# Altium integrated library Self made library.IntLib: 370 symbols (part 1 of 3) (continued)
## C_1206_100NF/50V (continued)
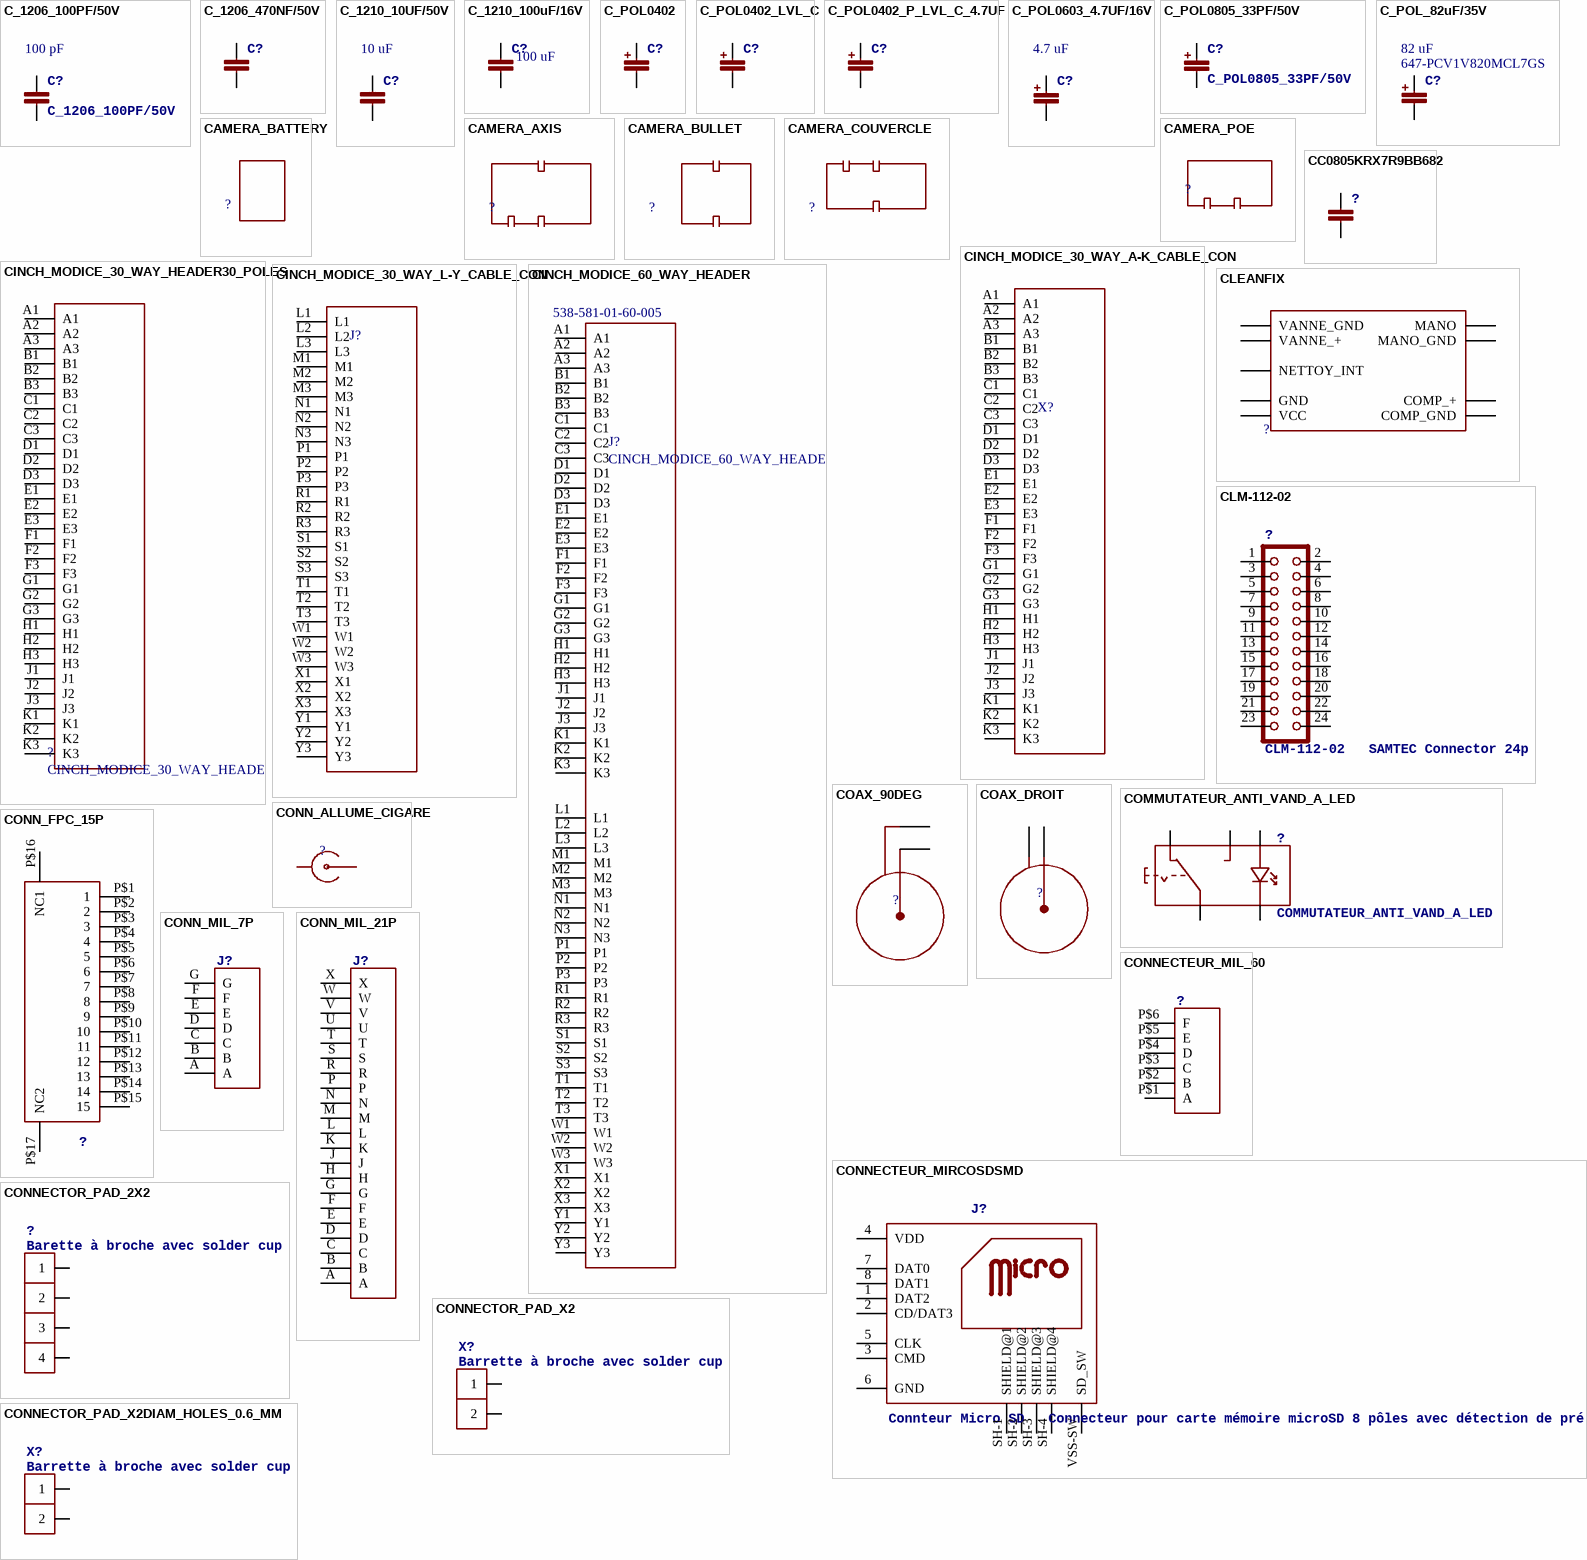
[diagram p6: symbols C_1206_100PF/50V to CONNECTOR_PAD_X2DIAM_HOLES_0.6_MM]

## C_1206_100PF/50V
designator C?  Capacitance: 100 pF
Manufacturer: Kemet; Manufacturer Part Number: C1206C101K5RACTU; Tolerance: 10 %; Type: SMD MLCC X7R 6.3 - 250 VDC Commerical Grade; Voltage Rating DC: 50 VDC; Case Length: 3.2 mm; Case Width: 1.6 mm; Class: Class 2; Dielectric: X7R; Digger DTR: CMP4208; Supplier 1: Mouser; RoHS: RoHS Compliant; Category: Multilayer Ceramic Capacitors MLCC - SMD/SMT; Stock 1: 0; Package/Case: 1206 (3216 metric); Packaging: Reel; Product: General Type MLCCs; Series: C1206C; Termination Style: SMD/SMT; Voltage Rating AC: -; Brand: Kemet; Case Code - in: 1206; Case Code - mm: 3216; Case Height: -; Maximum Operating Temperature: + 125 C; Minimum Operating Temperature: - 55 C; Minimum Order Quantity: 1; Reeling: True; ComponentLink1URL: http://www.kemet.com/Lists/ProductCatalog/Attachments/53/KEM_C1002_X7R_SMD.pdf; ComponentLink1Description: http://www.kemet.com/Lists/ProductCatalog/Attachments/53/KEM_C1002_X7R_SMD.pdf; Supplier Part Number 1: N/A
footprint 1206
pins: 1, 2

## C_1206_470NF/50V
designator C?
footprint 1206_capacitor
pins: 1, 2

## C_1210_10UF/50V
designator C?  Capacitance: 10 uF  (hidden comment: C_1210_10UF/50V)
Manufacturer: Murata Electronics; Manufacturer Part Number: GRM32DF51H106ZA01K; Tolerance: - 20 %, + 80 %; Type: General Purpose MLCC; Voltage Rating DC: 50 V; Case Height: 2 mm; Case Length: 3.2 mm; Case Width: 2.5 mm; Dielectric: Y5V; Digger CMP: CMP4434; Supplier 1: Mouser; RoHS: RoHS Compliant; Category: Multilayer Ceramic Capacitors MLCC - SMD/SMT; Stock 1: 8364; Pricing 1: 1=1.43, 10=0.974, 100=0.576, 1000=0.525, 4000=0.339, 8000=0.334, 24000=0.327 (CHF); Package/Case: 1210 (3225 metric); Packaging: Reel; Product: General Type MLCCs; Series: GRM; Termination Style: SMD/SMT; Brand: Murata Electronics; Case Code - in: 1210; Case Code - mm: 3225; Maximum Operating Temperature: + 85 C; Minimum Operating Temperature: - 30 C; Standard Pack Qty: 4000; RoHS - Mouser: Y; Minimum Order Quantity: 1; Reeling: True; ComponentLink1URL: http://www.murata.com/products/catalog/pdf/c02e.pdf; ComponentLink1Description: http://www.murata.com/products/catalog/pdf/c02e.pdf; Supplier Part Number 1: 81-GRM32DF51H106ZA1K
footprint 1210_tick
pins: P$1 1, P$2 2

## C_1210_100uF/16V
designator C?  Capacité électrique: 100 uF  (hidden comment: C_1210_100uF/16V)
Manufacturer 1: Kemet; Manufacturer Part Number 1: C1210C107M4PACTU; Description 1: Condensateurs céramique multicouches MLCC - CMS 100uF 16volts 20% X5R; Plage de températures de fonctionnement: - 55 C to + 85 C; Package/Boîte: 1210 (3225 metric); Conditionnement: Reel; Produit: General Type MLCCs; Série: C1210C; Style du raccordement: SMD/SMT; Tolérance: 20 %; Type: SMD MLCC X5R 4 - 50 VDC Commerical Grade; Tension de voltage CC: 16 V; Code de caisse - po: 1210; Code de caisse - mm: 3225; Longueur du boîtier: 3.2 mm; Largeur du boîtier: 2.5 mm; Classe: Class 2; Diélectrique: X5R; Température de fonctionnement max.: + 85 C; Température de fonctionnement min.: - 55 C; Quantité standard du lot: 1000; Coefficient/Code de température: +/- 15 %; Product Status: New Product; Supplier 1: Mouser; Supplier Part Number 1: 80-C1210C107M4PACTU; RoHS: RoHS Compliant; Category: Condensateurs céramique multicouches MLCC - CMS; Stock 1: 7452; Pricing 1: 1=2.51, 10=1.92, 100=1.73, 250=1.43, 500=1.30, 1000=0.838, 2000=0.809, 5000=0.778, 10000=0.734 (CHF); Tension de fonctionnement CA: -; Marque: Kemet; Hauteur du boîtier: -; Facteur de dissipation DF: -; Fabricant: Kemet; RoHS - Mouser: Y; Minimum Order Quantity: 1; Reeling: True; ComponentLink1URL: http://www.mouser.com/ds/2/212/KEM_C1006_X5R_SMD-348855.pdf; ComponentLink1Description: http://www.mouser.com/ds/2/212/KEM_C1006_X5R_SMD-348855.pdf
footprint 1210 _Kemet
pins: 1, 2

## C_POL0402
designator C?
footprint 0402_POL
pins: 1 +, 2 -

## C_POL0402_LVL_C
designator C?
footprint C0402_LVL_C
pins: 1 +, 2 -

## C_POL0402_P_LVL_C_4.7UF
designator C?
MANUFACTURER: AVX; MANUFACTURER_PART_NUMBER: F981A475MUALZT; UNIT_PRICE: 1.80; SUPPLIER: Mouser; SUPPLIER_PART_NUMBER: 581-F981A475MUALZT
footprint C0402_POL_LVL_C
pins: 1 +, 2 -

## C_POL0603_4.7UF/16V
designator C?, comment 4.7 uF
MANUFACTURER: AVX; MANUFACTURER_PART_NUMBER: F981C475MMA; UNIT_PRICE: 0.90; Description 1: Condensateurs au tantale - CMS Solides 16volts 4.7uF 0.85x1.6; Plage de températures de fonctionnement: - 55 C to + 125 C; Package/Boîte: 0603 (1608 metric); Conditionnement: Reel; Produit: Tantalum Solid Standard Grade - Other Various; Série: F98; Style du raccordement: SMD/SMT; Tolérance: 20 %; Tension de voltage: 16 V; ESR: 12 Ohms; Courant de fuite: 800 nA; Code de caisse - po: 0603; Code de caisse - mm: 1608; Longueur du boîtier: 1.6 mm; Largeur du boîtier: 0.85 mm; Facteur de dissipation DF: 12; Code caisse du fabricant: M Case; Catégorie du produit: SMD Tantalum Capacitors; Quantité standard du lot: 4000; Nom commercial: FRAMELESS; SUPPLIER: Mouser; SUPPLIER_PART_NUMBER: 647-F981C475MMA; Supplier 1: Mouser; Supplier Part Number 1: 647-F981C475MMA; Manufacturer 1: AVX; RoHS: RoHS Compliant; Category: Condensateurs au tantale - CMS Solides; Stock 1: 2925; Pricing 1: 1=0.784, 10=0.753, 100=0.303, 500=0.276, 1000=0.254, 2000=0.219, 4000=0.169, 8000=0.158 (CHF); Marque: AVX; Fabricant: AVX; RoHS - Mouser: Y; Minimum Order Quantity: 1; Reeling: True; ComponentLink1URL: http://www.mouser.com/ds/2/40/f98-220204.pdf; ComponentLink1Description: http://www.mouser.com/ds/2/40/f98-220204.pdf; Manufacturer Part Number 1: F981C475MMA; Capacité électrique: 4.7 uF
footprint 0603_POL
pins: 1 +, 2 -

## C_POL0805_33PF/50V
designator C?
footprint 0805
pins: 1 +, 2 -

## C_POL_82uF/35V
designator C?  Capacitance: 82 uF  Supplier Part Number 1: 647-PCV1V820MCL7GS  (hidden comment: C_POL_82uF/35V)
Manufacturer: Nichicon; Manufacturer Part Number: PCV1V820MCL7GS; Description: Aluminium Organic Polymer Capacitors 35V 82uF 105C; Tolerance: 20 %; Voltage Rating DC: 35 V; ESR: 24 mOhms; Leakage Current: 574 uA; Case Diameter: 8 mm; Case Length: 10 mm; Dissipation Factor DF: 0.12; Load Life: 3000 Hour; Ripple Current: 3600 mA; Supplier 1: Mouser; RoHS: RoHS Compliant; Category: Aluminium Organic Polymer Capacitors; Stock 1: 1270; Pricing 1: 1=3.36, 10=2.59, 100=1.93, 500=1.31, 1000=1.16, 2500=1.07, 10000=1.03 (CHF); Packaging: Reel; Product: Organic Polymer Aluminum - SMD Capacitors; Series: PCV; Termination Style: SMD/SMT; Brand: Nichicon; Maximum Operating Temperature: + 105 C; Minimum Operating Temperature: - 55 C; Product Type: Can; Standard Pack Qty: 500; RoHS - Mouser: Y; Minimum Order Quantity: 1; Reeling: True; ComponentLink1URL: http://www.mouser.com/ds/2/293/e-cv-8125.pdf; ComponentLink1Description: http://www.mouser.com/ds/2/293/e-cv-8125.pdf
footprint PCV_8x10
pins: 1 +, 2 -

## CAMERA_AXIS
designator ?
footprint 0805

## CAMERA_BATTERY
designator ?

## CAMERA_BULLET
designator ?
footprint 0805

## CAMERA_COUVERCLE
designator ?
footprint 0805

## CAMERA_POE
designator ?
footprint 0805

## CC0805KRX7R9BB682
designator ?
footprint 0805
pins: 1, 2

## CINCH_MODICE_30_WAY_A-K_CABLE_CON
designator X?
footprint CINCH_MODICE_60_WAY_HEADER
pins: A1, A2, A3, B1, B2, B3, C1, C2, C3, D1, D2, D3, E1, E2, E3, F1, F2, F3, G1, G2, G3, H1, H2, H3, J1, J2, J3, K1, K2, K3

## CINCH_MODICE_30_WAY_HEADER30_POLES
designator ?, comment CINCH_MODICE_30_WAY_HEADER
footprint CINCH_MODICE_30_WAY_HEADER
pins: A1, A2, A3, B1, B2, B3, C1, C2, C3, D1, D2, D3, E1, E2, E3, F1, F2, F3, G1, G2, G3, H1, H2, H3, J1, J2, J3, K1, K2, K3

## CINCH_MODICE_30_WAY_L-Y_CABLE_CON
designator J?
footprint CINCH_MODICE_60_WAY_HEADER
pins: L1, L2, L3, M1, M2, M3, N1, N2, N3, P1, P2, P3, R1, R2, R3, S1, S2, S3, T1, T2, T3, W1, W2, W3, X1, X2, X3, Y1, Y2, Y3

## CINCH_MODICE_60_WAY_HEADER
designator J?  Supplier Part Number 1: 538-581-01-60-005
Manufacturer: Cinch; Manufacturer Part Number: 581-01-60-005; Current Rating: 3 A; Gender: Male; Mounting Angle: Vertical; Number of Positions: 60 Position; Pitch: 2.54 mm; Insulation Resistance: 1 GOhms; Digger CMP: CMP4441; Supplier 1: Mouser; RoHS: In Transition; Category: Automotive Connectors; Stock 1: 22; Pricing 1: 1=24.30, 5=22.76, 10=21.71, 25=21.19, 50=19.03, 100=18.35, 250=17.64, 500=17.22 (CHF); Color: Black; Contact Plating: Gold; Features: ModICE SHS, header, without ferrites; Number of Rows: 3 Row; Operating Temperature Range: - 55 C to + 135 C; Product: Headers; Series: ModICE; Termination Style: Crimp; Type: Without Ferrite; Brand: Cinch; Contact Material: Copper Alloy; Flammability Rating: UL 94 V-0; Mounting Style: Wire; Product Category: ModICE LE Headers - Modular I/O Connectors; RoHS - Mouser: T; Minimum Order Quantity: 1; Reeling: False; ComponentLink1URL: http://www.mouser.com/ds/2/643/1219441010-5810160031S_ICE60_rev_C-475596.pdf; ComponentLink1Description: http://www.mouser.com/ds/2/643/1219441010-5810160031S_ICE60_rev_C-475596.pdf
footprint CINCH_MODICE_60_WAY_HEADER
pins: A1, A2, A3, B1, B2, B3, C1, C2, C3, D1, D2, D3, E1, E2, E3, F1, F2, F3, G1, G2, G3, H1, H2, H3, J1, J2, J3, K1, K2, K3, L1, L2, L3, M1, M2, M3, N1, N2, N3, P1, P2, P3, R1, R2, R3, S1, S2, S3, T1, T2, T3, W1, W2, W3, X1, X2, X3, Y1, Y2, Y3

## CLEANFIX
designator ?
footprint 61302021121
pins: 1 COMP_+, 2 COMP_GND, 3 GND, 4 MANO, 5 MANO_GND, 6 NETTOY_INT, 7 VANNE_+, 8 VANNE_GND, 9 VCC

## CLM-112-02
designator ?, comment CLM-112-02   SAMTEC Connector 24p
footprint SAMTEC_CLM
pins: 1, 2, 3, 4, 5, 6, 7, 8, 9, 10, 11, 12, 13, 14, 15, 16, 17, 18, 19, 20, 21, 22, 23, 24

## COAX_90DEG
designator ?
footprint PAD_X2_1.1
pins: 1 P$1, 2 P$2

## COAX_DROIT
designator ?
footprint PAD_X2_1.1
pins: 1 P$1, 2 P$2

## COMMUTATEUR_ANTI_VAND_A_LED
designator ?
pins: P$1 A, P$2 A1, P$3 A2, P$4 A3, P$5 P$6 C

## CONN_ALLUME_CIGARE
designator ?
footprint 0805

## CONN_FPC_15P
designator ?
footprint FPC_ZIF_05MMX15
pins: P$1 1, P$2 2, P$3 3, P$4 4, P$5 5, P$6 6, P$7 7, P$8 8, P$9 9, P$10 10, P$11 11, P$12 12, P$13 13, P$14 14, P$15 15, P$16 NC1, P$17 NC2

## CONN_MIL_7P
designator J?
footprint CON_MIL_BIDON_7P
pins: A, B, C, D, E, F, G

## CONN_MIL_21P
designator J?
footprint CON_MIL_BIDON_21P
pins: A, B, C, D, E, F, G, H, J, K, L, M, N, P, R, S, T, U, V, W, X

## CONNECTEUR_MIL_60
designator ?
footprint COM6P_1.5MM2
pins: P$1 A, P$2 B, P$3 C, P$4 D, P$5 E, P$6 F

## CONNECTEUR_MIRCOSDSMD
designator J?, comment Connteur Micro SD   Connecteur pour carte mémoire microSD 8 pôles avec détection de présence, version Push-Push
footprint MICROSD_CARD_CONNECTOR
pins: 1 DAT2, 2 CD/DAT3, 3 CMD, 4 VDD, 5 CLK, 6 GND, 7 DAT0, 8 DAT1, SH-1 SHIELD@1, SH-2 SHIELD@2, SH-3 SHIELD@3, SH-4 SHIELD@4, VSS-SW SD_SW

## CONNECTOR_PAD_2X2
designator ?, comment Barette à broche avec solder cup
footprint HEADER_2x2_BONDING_WIRE
pins: 1, 2, 3, 4

## CONNECTOR_PAD_X2
designator X?, comment Barrette à broche avec solder cup
MANUFACTURER: preci-dip; MANUFACTURER_PART_NUMBER: 380-PP-1NN-00-001101; UNIT_PRICE: 0.4; SUPPLIER: preci-dip; SUPPLIER_PART_NUMBER: 380-PP-1NN-00-001101
footprint HEADER_2
pins: 1, 2

## CONNECTOR_PAD_X2DIAM_HOLES_0.6_MM
designator X?, comment Barrette à broche avec solder cup
MANUFACTURER: preci-dip; MANUFACTURER_PART_NUMBER: 380-PP-1NN-00-001101; UNIT_PRICE: 0.4; SUPPLIER: preci-dip; SUPPLIER_PART_NUMBER: 380-PP-1NN-00-001101
footprint HEADER_2_SMAL_HOLES
pins: 1, 2

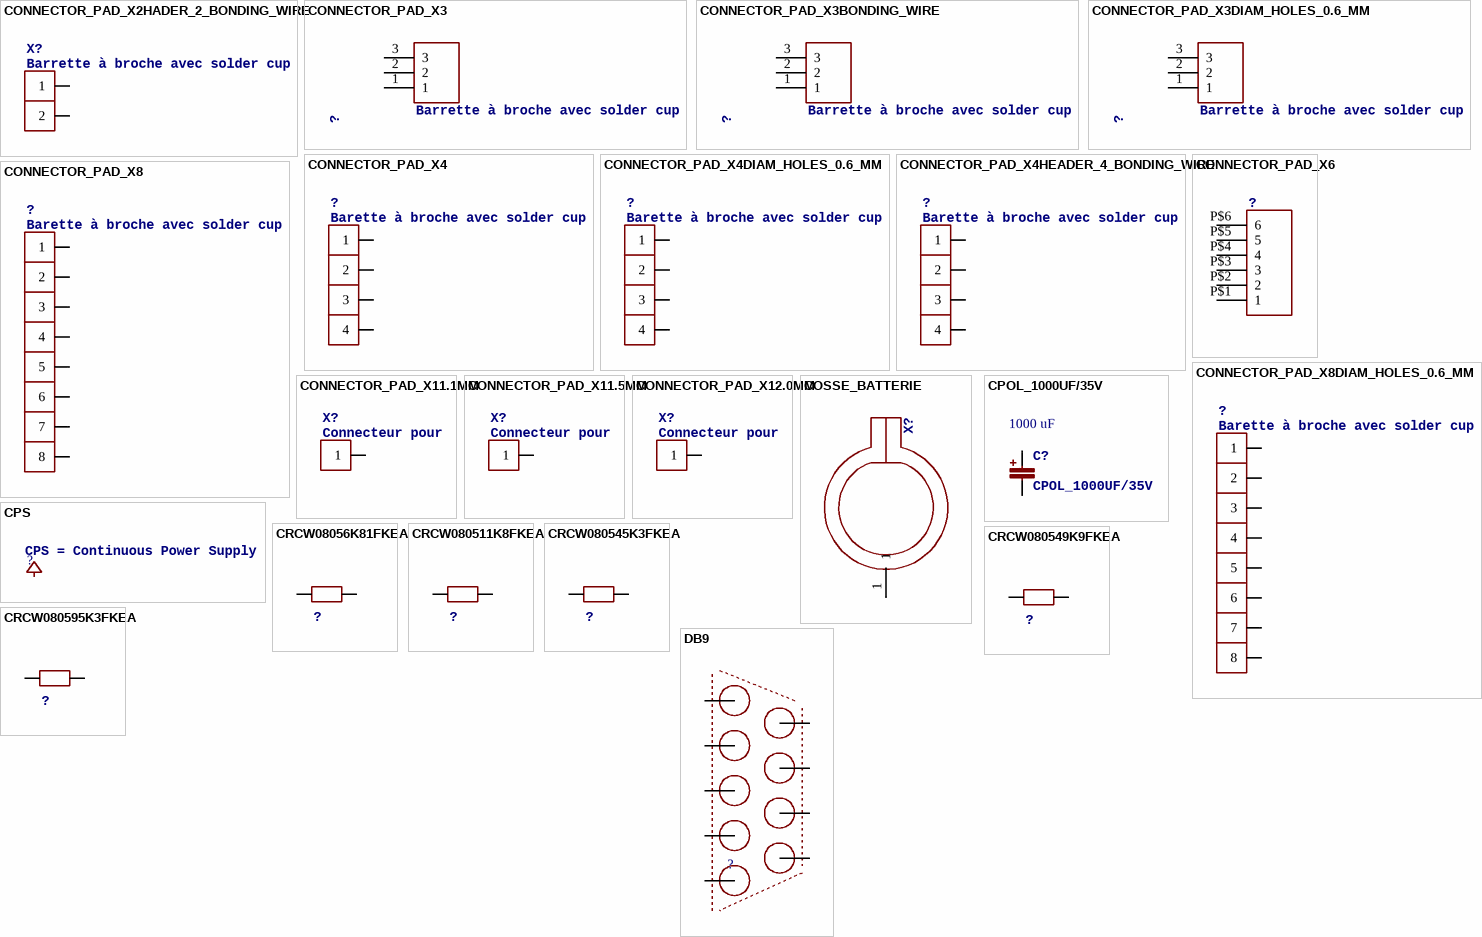
[diagram p7: symbols CONNECTOR_PAD_X2HADER_2_BONDING_WIRE to DB9]

## CONNECTOR_PAD_X2HADER_2_BONDING_WIRE
designator X?, comment Barrette à broche avec solder cup
footprint HEADER_2_BONDING_WIRE
pins: 1, 2

## CONNECTOR_PAD_X3
designator ?, comment Barrette à broche avec solder cup
MANUFACTURER: preci-dip; MANUFACTURER_PART_NUMBER: 380-PP-1NN-00-001101; UNIT_PRICE: 0.5; SUPPLIER: preci-dip; SUPPLIER_PART_NUMBER: 380-PP-1NN-00-001101
footprint HEADER_3
pins: 1, 2, 3

## CONNECTOR_PAD_X3BONDING_WIRE
designator ?, comment Barrette à broche avec solder cup
footprint HEADER_3_BONDING_WIRE
pins: 1, 2, 3

## CONNECTOR_PAD_X3DIAM_HOLES_0.6_MM
designator ?, comment Barrette à broche avec solder cup
MANUFACTURER: preci-dip; MANUFACTURER_PART_NUMBER: 380-PP-1NN-00-001101; UNIT_PRICE: 0.5; SUPPLIER: preci-dip; SUPPLIER_PART_NUMBER: 380-PP-1NN-00-001101
footprint HEADER_3_SMAL_HOLES
pins: 1, 2, 3

## CONNECTOR_PAD_X4
designator ?, comment Barette à broche avec solder cup
MANUFACTURER: preci-dip; MANUFACTURER_PART_NUMBER: 380-PP-1NN-00-001101; UNIT_PRICE: 0.65; SUPPLIER: preci-dip; SUPPLIER_PART_NUMBER: 380-PP-1NN-00-001101
footprint HEADER_4
pins: 1, 2, 3, 4

## CONNECTOR_PAD_X4DIAM_HOLES_0.6_MM
designator ?, comment Barette à broche avec solder cup
MANUFACTURER: preci-dip; MANUFACTURER_PART_NUMBER: 380-PP-1NN-00-001101; UNIT_PRICE: 0.65; SUPPLIER: preci-dip; SUPPLIER_PART_NUMBER: 380-PP-1NN-00-001101
footprint HEADER_4_SMAL_HOLES
pins: 1, 2, 3, 4

## CONNECTOR_PAD_X4HEADER_4_BONDING_WIRE
designator ?, comment Barette à broche avec solder cup
footprint HEADER_4_BONDING_WIRE
pins: 1, 2, 3, 4

## CONNECTOR_PAD_X6
designator ?
footprint COM6P_1.5MM2
pins: P$1 1, P$2 2, P$3 3, P$4 4, P$5 5, P$6 6

## CONNECTOR_PAD_X8
designator ?, comment Barette à broche avec solder cup
MANUFACTURER: preci-dip; MANUFACTURER_PART_NUMBER: 380-PP-1NN-00-001101; UNIT_PRICE: 1.25; SUPPLIER: preci-dip; SUPPLIER_PART_NUMBER: 380-PP-1NN-00-001101
footprint HEADER_8
pins: 1, 2, 3, 4, 5, 6, 7, 8

## CONNECTOR_PAD_X8DIAM_HOLES_0.6_MM
designator ?, comment Barette à broche avec solder cup
MANUFACTURER: preci-dip; MANUFACTURER_PART_NUMBER: 380-PP-1NN-00-001101; UNIT_PRICE: 1.25; SUPPLIER: preci-dip; SUPPLIER_PART_NUMBER: 380-PP-1NN-00-001101
footprint HEADER_8_SMAL_HOLES
pins: 1, 2, 3, 4, 5, 6, 7, 8

## CONNECTOR_PAD_X11.1MM
designator X?, comment Connecteur pour câble à souder (PAD)    1.1MM : 0.5 - 0.75 mm2   1.5MM : 1.0 - 1.5 mm2   2.0MM : 2.5mm2
footprint PAD_X1_1.1
pins: 1

## CONNECTOR_PAD_X11.5MM
designator X?, comment Connecteur pour câble à souder (PAD)    1.1MM : 0.5 - 0.75 mm2   1.5MM : 1.0 - 1.5 mm2   2.0MM : 2.5mm2
footprint PAD_X1_1.5
pins: 1

## CONNECTOR_PAD_X12.0MM
designator X?, comment Connecteur pour câble à souder (PAD)    1.1MM : 0.5 - 0.75 mm2   1.5MM : 1.0 - 1.5 mm2   2.0MM : 2.5mm2
footprint PAD_X1_2.0
pins: 1

## COSSE_BATTERIE
designator X?
footprint WURTH_WR-WTB_3.96MM_3P
pins: 1 (power)

## CPOL_1000UF/35V
designator C?  Capacitance: 1000 uF
Manufacturer: Nichicon; Manufacturer Part Number: UHE1V102MHD; Tolerance: 20 %; Voltage Rating DC: 35 V; Leakage Current: 350 uA; Case Diameter: 12.5 mm; Case Length: 25 mm; Dissipation Factor DF: 0.12; Load Life: 10000 Hour; Ripple Current: 2230 mA; Digger CMP: CMP3862; Supplier 1: Mouser; RoHS: RoHS Compliant; Category: Aluminium Electrolytic Capacitors - Leaded; Stock 1: 7980; Pricing 1: 1=0.999, 10=0.629, 100=0.490, 500=0.420, 1000=0.338, 5000=0.321, 10000=0.310, 25000=0.297 (CHF); Dimensions: 12.5 mm Dia. x 25 mm L; Packaging: Bulk; Product: Low Impedance Electrolytic Capacitors; Series: UHE; Termination Style: Radial; Brand: Nichicon; Lead Spacing: 5 mm; Maximum Operating Temperature: + 105 C; Product Category: Low Impedance Aluminum Electrolytic Capacitors; Standard Pack Qty: 100; RoHS - Mouser: Y; Minimum Order Quantity: 1; Reeling: False; ComponentLink1URL: http://www.mouser.com/ds/2/293/e-he-28896.pdf; ComponentLink1Description: http://www.mouser.com/ds/2/293/e-he-28896.pdf; Supplier Part Number 1: 647-UHE1V102MHD
footprint C_NRSA_RADIAL
pins: +, -

## CPS
designator ?, comment CPS = Continuous Power Supply
pins: ?1 CPS (oe)

## CRCW08056K81FKEA
designator ?
footprint 0805
pins: 1, 2

## CRCW080511K8FKEA
designator ?
footprint 0805
pins: 1, 2

## CRCW080545K3FKEA
designator ?
footprint 0805
pins: 1, 2

## CRCW080549K9FKEA
designator ?
footprint 0805
pins: 1, 2

## CRCW080595K3FKEA
designator ?
footprint 0805
pins: 1, 2

## DB9
designator ?
footprint TYCO_TDE_SUBD_9P
pins: 1, 2, 3, 4, 5, 6, 7, 8, 9

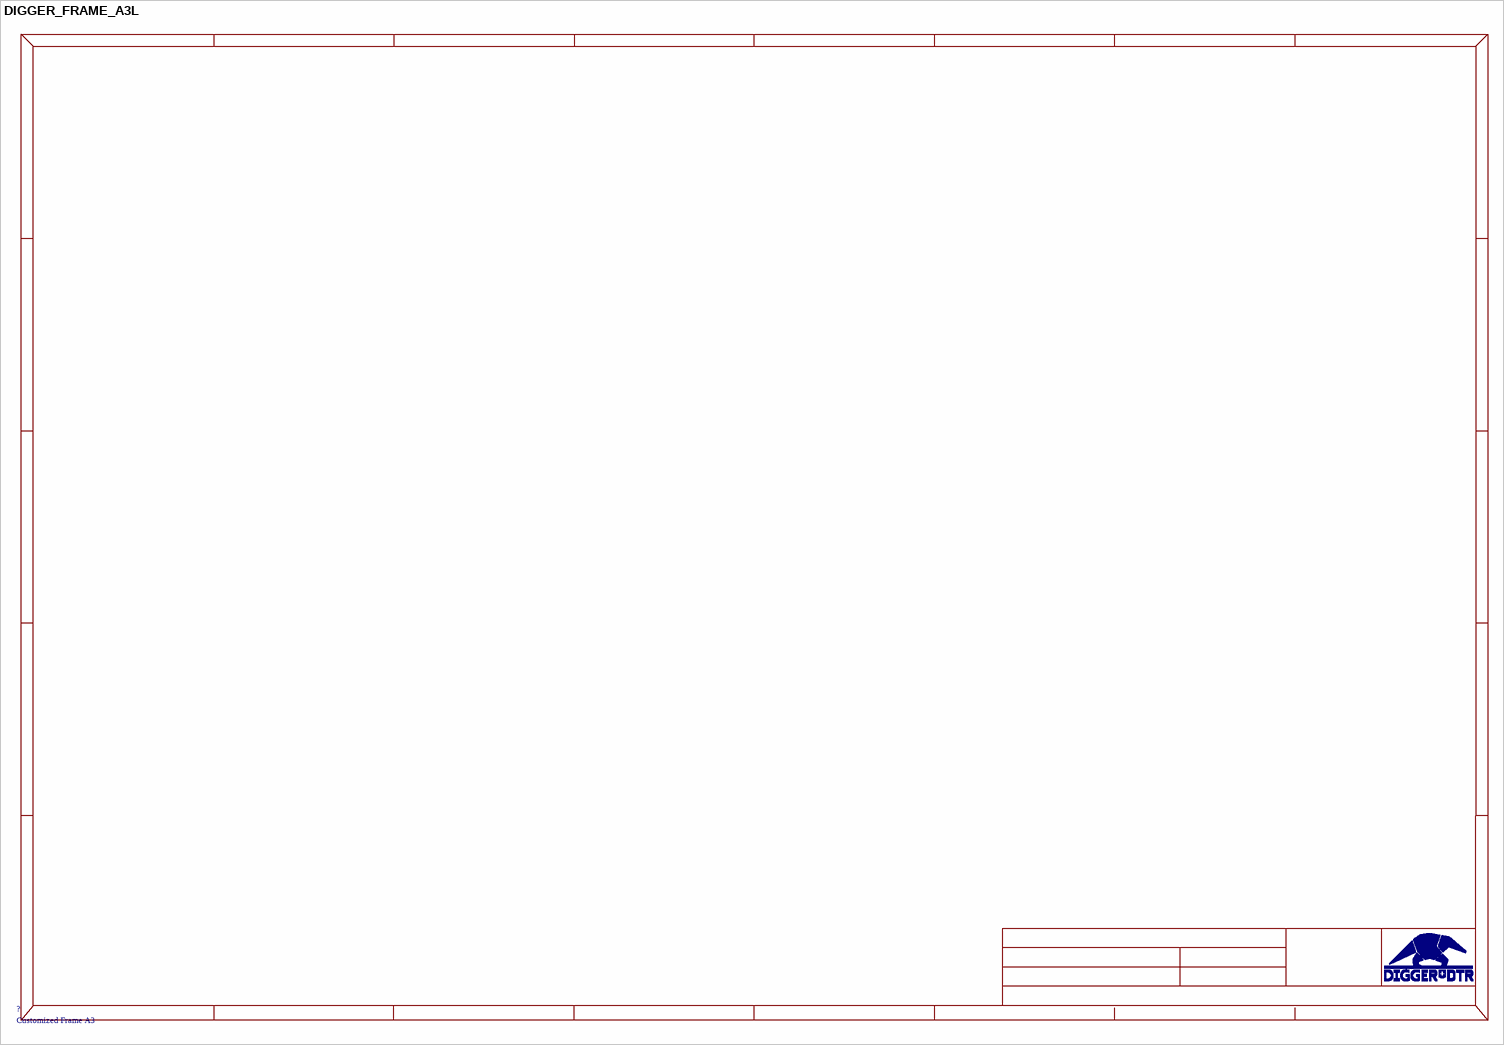
[diagram p8: symbol DIGGER_FRAME_A3L]

## DIGGER_FRAME_A3L
designator ?, comment Customized Frame A3

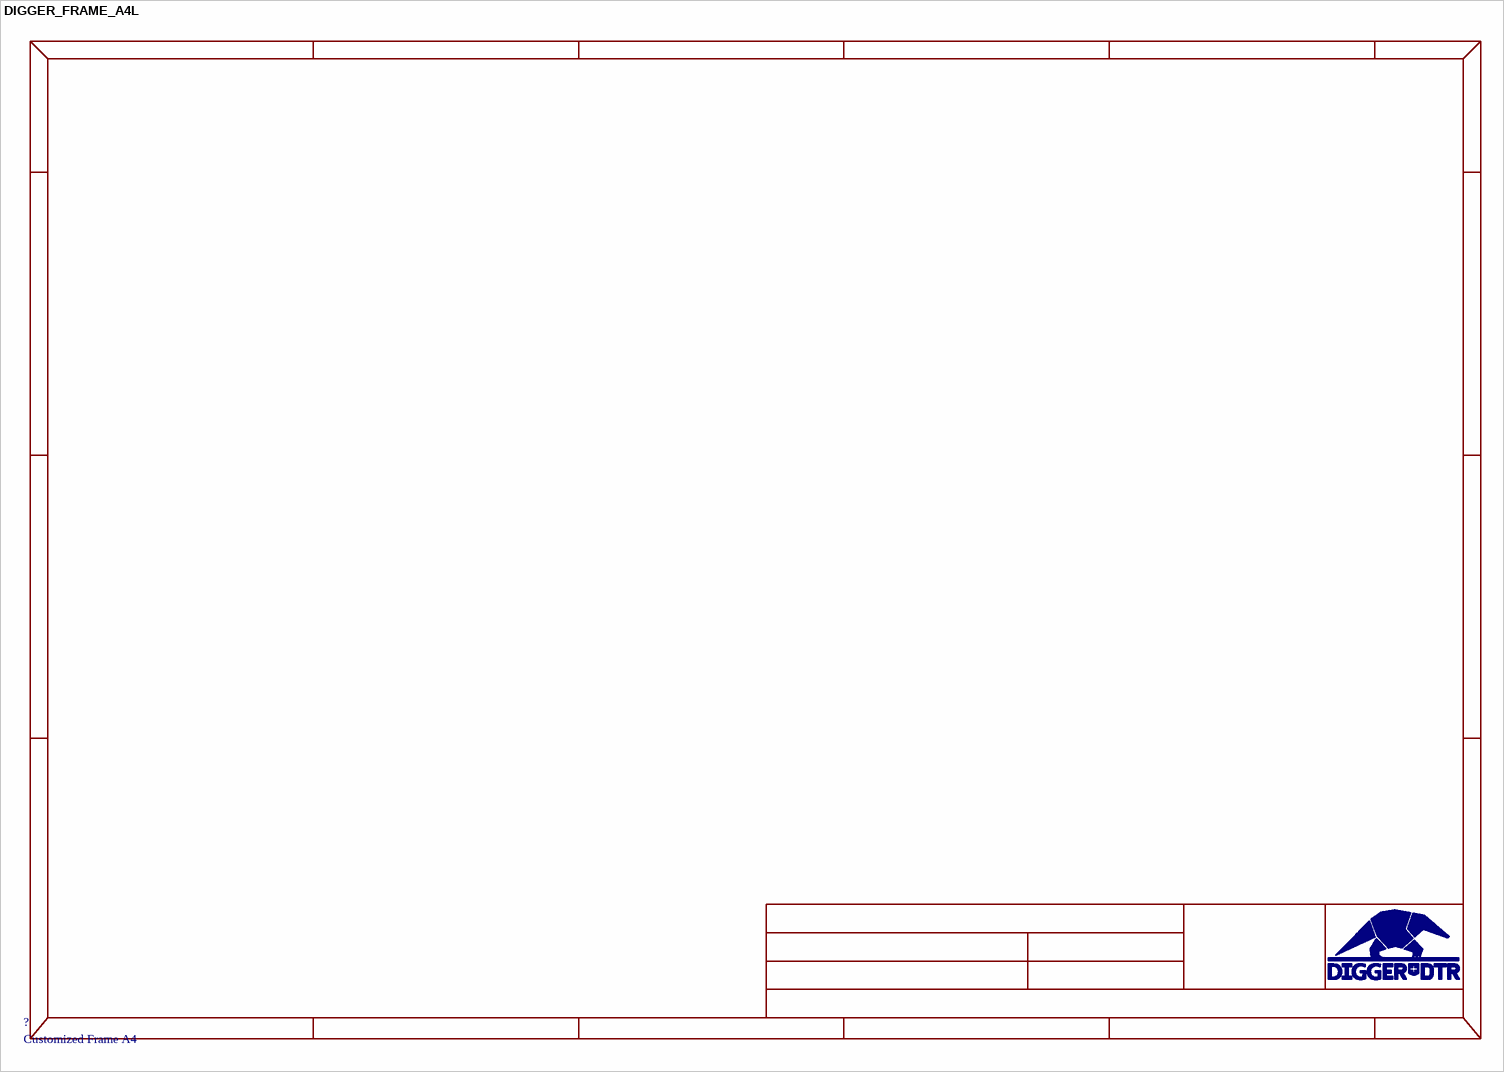
[diagram p9: symbol DIGGER_FRAME_A4L]

## DIGGER_FRAME_A4L
designator ?, comment Customized Frame A4

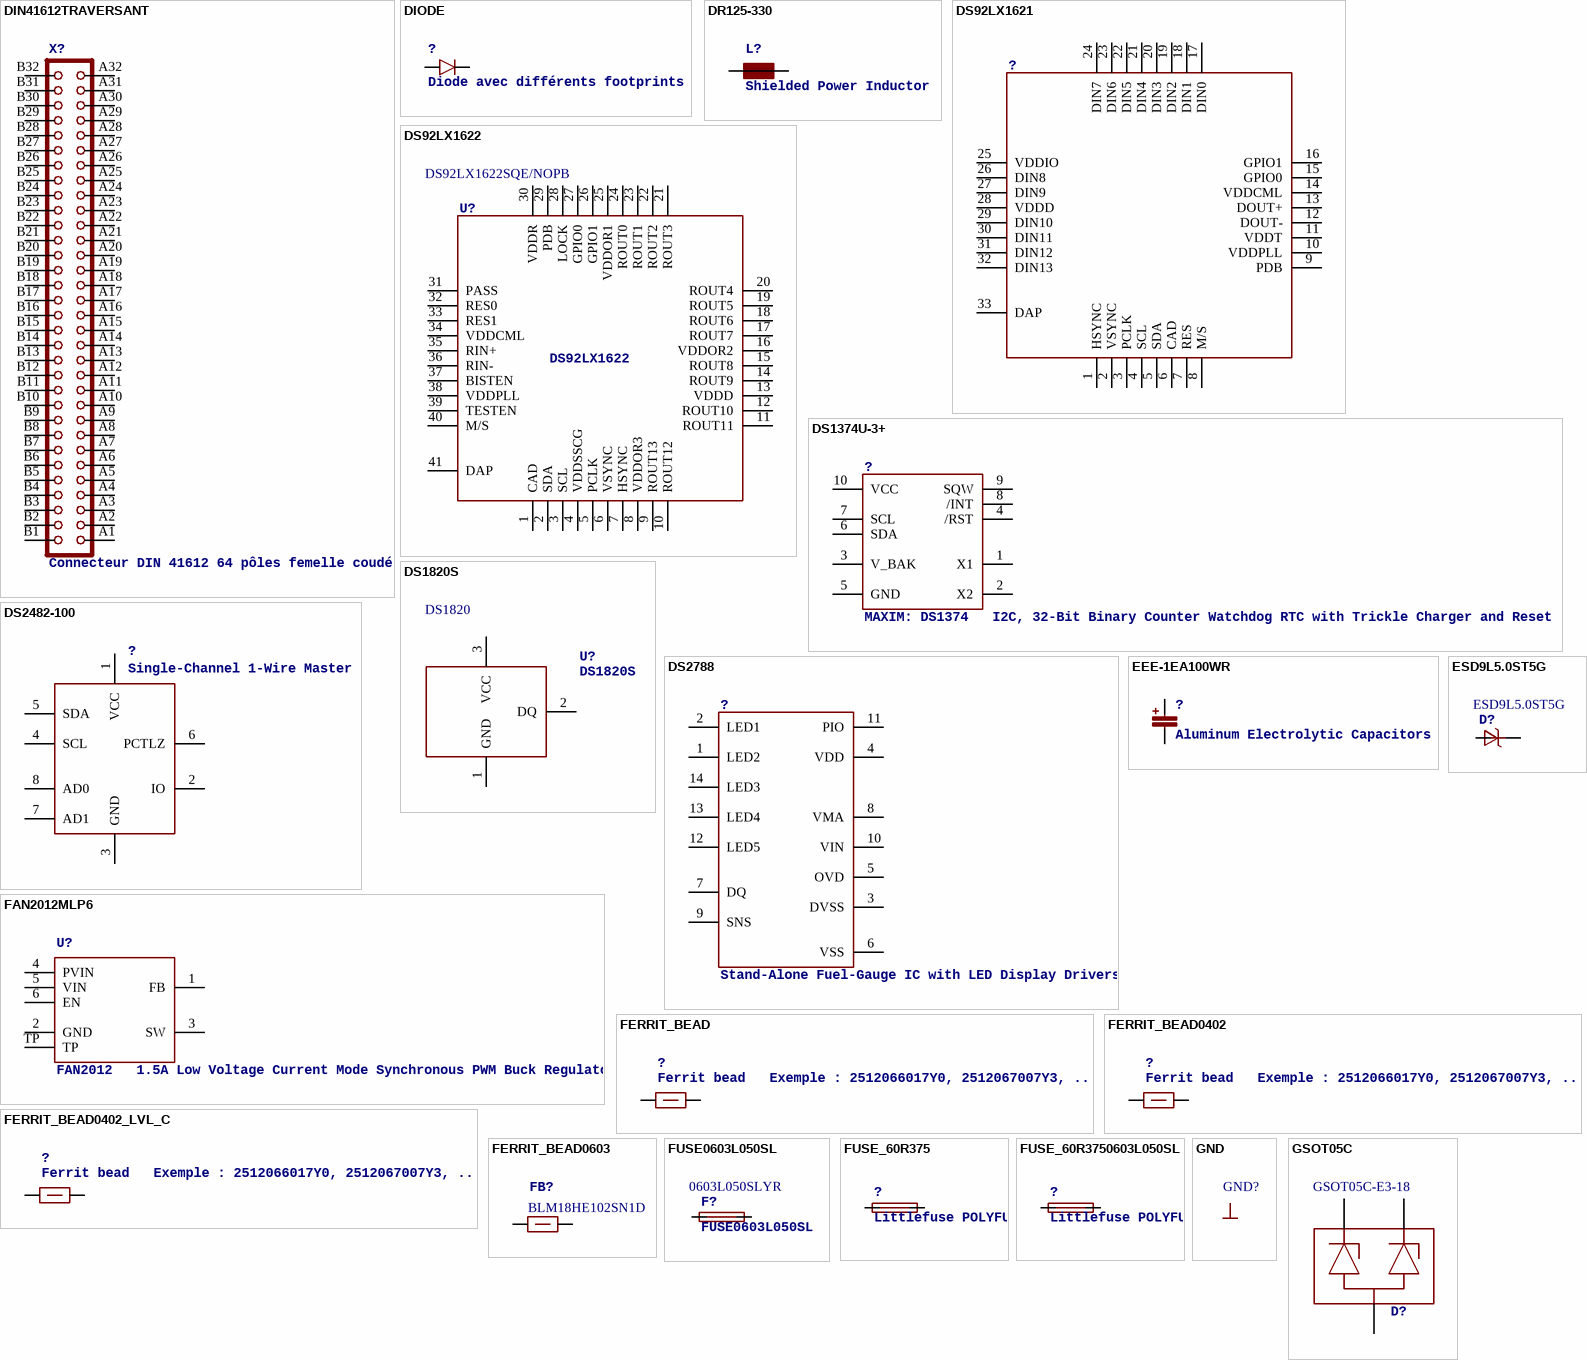
[diagram p10: symbols DIN41612TRAVERSANT to GSOT05C]

## DIN41612TRAVERSANT
designator X?, comment Connecteur DIN 41612 64 pôles femelle coudé
footprint CONNECTEUR_64P
pins: A1, A2, A3, A4, A5, A6, A7, A8, A9, A10, A11, A12, A13, A14, A15, A16, A17, A18, A19, A20, A21, A22, A23, A24, A25, A26, A27, A28, A29, A30, A31, A32, B1, B2, B3, B4, B5, B6, B7, B8, B9, B10, B11, B12, B13, B14, B15, B16, B17, B18, B19, B20, B21, B22, B23, B24, B25, B26, B27, B28, B29, B30, B31, B32

## DIODE
designator ?, comment Diode avec différents footprints
footprint DIODE_603
pins: A, C

## DR125-330
designator L?, comment Shielded Power Inductor
footprint DR125
pins: 1, 2

## DS92LX1621
designator ?
MANUFACTURER: Texas Instrument; MANUFACTURER_PART_NUMBER: DS92LX1621SQE/NOPB; UNIT_PRICE: 13.00; SUPPLIER: Mouser; SUPPLIER_PART_NUMBER: 926-DS92LX1621SQENPB
footprint WQFN32PIN
pins: 1 HSYNC, 2 VSYNC, 3 PCLK, 4 SCL, 5 SDA, 6 CAD, 7 RES, 8 M/S, 9 PDB, 10 VDDPLL, 11 VDDT, 12 DOUT-, 13 DOUT+, 14 VDDCML, 15 GPIO0, 16 GPIO1, 17 DIN0, 18 DIN1, 19 DIN2, 20 DIN3, 21 DIN4, 22 DIN5, 23 DIN6, 24 DIN7, 25 VDDIO, 26 DIN8, 27 DIN9, 28 VDDD, 29 DIN10, 30 DIN11, 31 DIN12, 32 DIN13, 33 DAP

## DS92LX1622
designator U?  Manufacturer Part Number 1: DS92LX1622SQE/NOPB
Manufacturer 1: Texas Instruments; Description 1: Sérialiseurs et désérialiseurs - Serdes 50MHz Link III Serial & Deserial; Débit de données: 900 Mbit/s; Type d'entrée: CML; Nombre de sorties: 18; Plage de températures de fonctionnement: - 40 C to + 85 C; Type de sortie: LVCMOS; Package/Boîte: WQFN-40; Conditionnement: Reel; Style de montage: SMD/SMT; Nombre d'entrées: 1; Courant de fonctionnement: 1 uA; Kit de développement: LX16EVK01/NOPB; Température de fonctionnement max.: + 85 C; Température de fonctionnement min.: - 40 C; Tension d'alimentation de fonctionnement: 1.71 V to 1.89 V; Quantité standard du lot: 250; Tension d’alimentation - Max.: 1.89 V, 3.6 V; Tension d’alimentation - Min.: 1.71 V, 3 V; Supplier 1: Mouser; Supplier Part Number 1: 926-DS92LX1622SQENPB; RoHS: RoHS Compliant; Category: Sérialiseurs et désérialiseurs - Serdes; Stock 1: 1507; Pricing 1: 1=11.80, 10=10.62, 25=9.95, 50=9.67, 100=8.74, 250=8.02, 500=7.32, 750=6.75, 1000=6.08 (CHF); Série: DS92LX1622; Type: Deserializer; Marque: Texas Instruments; Fabricant: Texas Instruments; RoHS - Mouser: Y; Minimum Order Quantity: 1; Reeling: True; ComponentLink1URL: http://www.mouser.com/ds/2/405/ds92lx1622-555864.pdf; ComponentLink1Description: http://www.mouser.com/ds/2/405/ds92lx1622-555864.pdf
footprint WQFN40PIN
pins: 1 CAD, 2 SDA, 3 SCL, 4 VDDSSCG, 5 PCLK, 6 VSYNC, 7 HSYNC, 8 VDDOR3, 9 ROUT13, 10 ROUT12, 11 ROUT11, 12 ROUT10, 13 VDDD, 14 ROUT9, 15 ROUT8, 16 VDDOR2, 17 ROUT7, 18 ROUT6, 19 ROUT5, 20 ROUT4, 21 ROUT3, 22 ROUT2, 23 ROUT1, 24 ROUT0, 25 VDDOR1, 26 GPIO1, 27 GPIO0, 28 LOCK, 29 PDB, 30 VDDR, 31 PASS, 32 RES0, 33 RES1, 34 VDDCML, 35 RIN+, 36 RIN-, 37 BISTEN, 38 VDDPLL, 39 TESTEN, 40 M/S, 41 DAP

## DS1374U-3+
designator ?, comment MAXIM: DS1374   I2C, 32-Bit Binary Counter Watchdog RTC with Trickle Charger and Reset Input/Output   The DS1374 is a 32-bit binary counter designed to contin- uously count time in seconds. An additional counter gen- erates a periodic alarm or serves as a watchdog timer. If disabled, this counter can be used as 3 bytes of non- volatile (NV) RAM. Separate output pins are provided for an interrupt and a square wave at one of four selectable frequencies. A precision temperature-compensated refer- ence and comparator circuit monitor the status of VCC to detect power failures, provide a reset output, and auto- matically switch to the backup supply when necessary. Additionally, the reset pin is monitored as a pushbutton input for externally generating a reset. The device is pro- grammed serially through an I2C serial interface.
footprint U_MAX10
pins: 1 X1, 2 X2, 3 V_BAK, 4 /RST, 5 GND, 6 SDA, 7 SCL, 8 /INT, 9 SQW, 10 VCC

## DS1820S
designator U?  Manufacturer Part Number: DS1820
High Precision 1-Wire Digital Thermometer; Manufacturer: Maxim Integrated; Sensor Type: Digital, Local; Sensing Temperature - Local: -55°C ~ 125°C; Output Type: 1-Wire®; Voltage - Supply: 3 V ~ 5.5 V; Resolution: 7 b; Accuracy - Highest (Lowest): ±0.5°C (±2°C); Test Condition: -10°C ~ 85°C (-55°C ~ 125°C); Digger CMP: CMP2480; RoHS: RoHS Compliant; Category: Sensors, Transducers; Packaging: Bulk; Sensing Temperature - Remote: -; Features: Programmable Limit; Operating Temperature: -55°C ~ 125°C; Package / Case: TO-226-3, TO-92-3 (TO-226AA); Supplier Device Package: TO-92-3; ComponentLink1URL: http://datasheets.maximintegrated.com/en/ds/DS18S20.pdf; ComponentLink1Description: http://datasheets.maximintegrated.com/en/ds/DS18S20.pdf; Supplier: Distrelec; Supplier Part Number: 663463
footprint TO92
pins: 1 GND, 2 DQ, 3 VCC

## DS2482-100
designator ?, comment Single-Channel 1-Wire Master
MANUFACTURER: Maxim Integrated; MANUFACTURER_PART_NUMBER: DS2482S-100+; UNIT_PRICE: 1.64; SUPPLIER: mouser; SUPPLIER_PART_NUMBER: 700-DS2482S-100
footprint SOIC8
pins: 1 VCC, 2 IO, 3 GND, 4 SCL, 5 SDA, 6 PCTLZ, 7 AD1, 8 AD0

## DS2788
designator ?, comment Stand-Alone Fuel-Gauge IC with LED Display Drivers
MANUFACTURER: Maxim Integrated; MANUFACTURER_PART_NUMBER: DS2788E+; UNIT_PRICE: 8.97; SUPPLIER: mouser; SUPPLIER_PART_NUMBER: 700-DS2788E
footprint TSSOP14
pins: 1 LED2, 2 LED1, 3 DVSS, 4 VDD, 5 OVD, 6 VSS, 7 DQ, 8 VMA, 9 SNS, 10 VIN, 11 PIO, 12 LED5, 13 LED4, 14 LED3